# Altium footprint library PCB贴片元件封装库.pcblib: 366 footprints (part 4 of 23)
Each footprint in its own frame and in the unit in brackets; x right, y up, seen from the top. Pads: shape width x height; smd on the part's side, far side on the other; paste and mask are expansions set on the pad; w line width, h text height; cw(c..) or ccw(c..) is an arc to the next point about the centre after c.
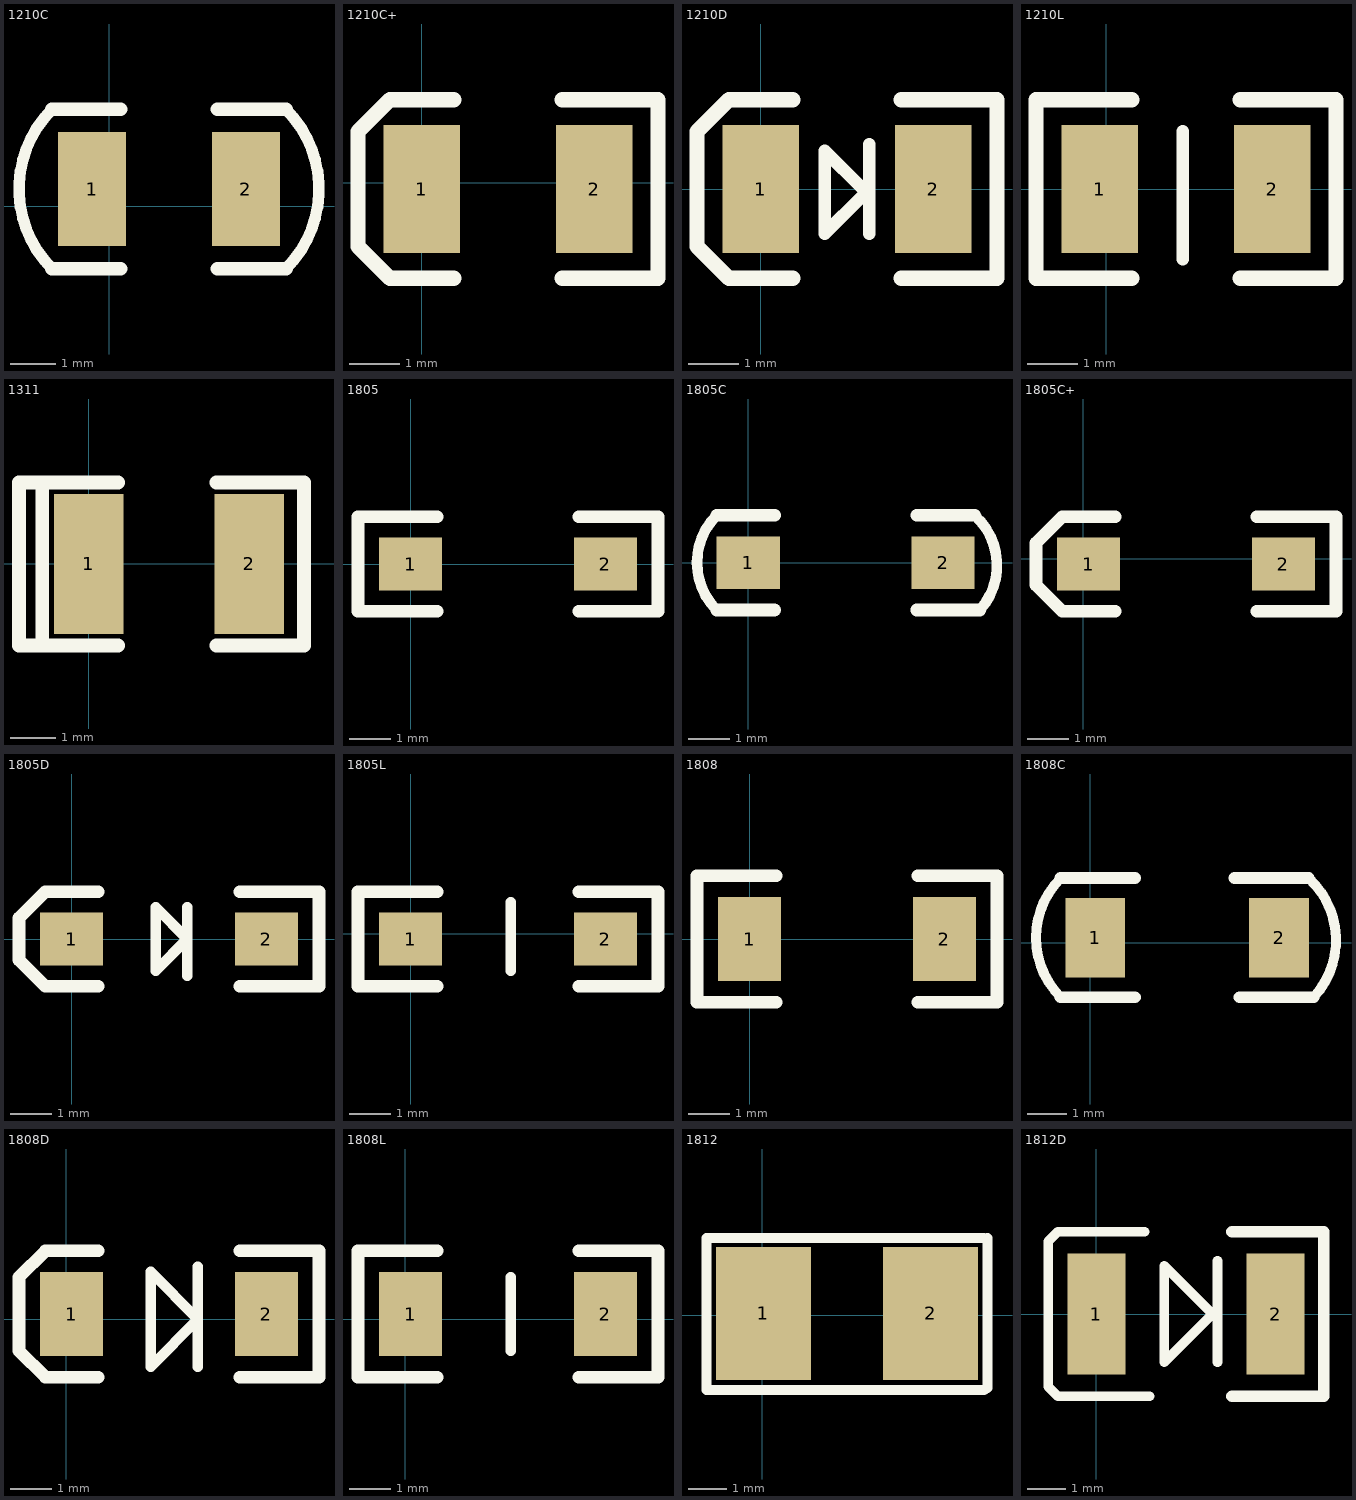
[diagram p3: the footprints below, top view; thin cyan lines are the x and y axes]

## 1210C [mil]
pads (2):
  rect 60x100 smd: 1(-15,15) 2(120,15)
TopOverlay:
  lines w10: -50,-55 cw(c20,15) -50,85 ; 155,-55 ccw(c85,15) 155,85
  lines w12: -50,-55 10,-55 ; -50,85 10,85 ; 95,-55 155,-55 ; 95,85 155,85

## 1210C+ [mil]
pads (2):
  rect 60x100 smd: 1(0,-5) 2(135,-5)
TopOverlay:
  lines w12: 25,-75 -25,-75 -50,-50 -50,40 -25,65 25,65 ; 110,-75 185,-75 185,65 110,65

## 1210D [mil]
pads (2):
  rect 60x100 smd: 1(0,0) 2(135,0)
TopOverlay:
  lines w10: 80,-5 50,-35 50,30 80,0 ; 85,-35 85,35
  lines w12: 25,-70 -25,-70 -50,-45 -50,45 -25,70 25,70 ; 110,-70 185,-70 185,70 110,70

## 1210L [mil]
pads (2):
  rect 60x100 smd: 1(-5,0) 2(130,0)
TopOverlay:
  lines w10: 60,-55 60,45
  lines w12: 20,-70 -55,-70 -55,70 20,70 ; 105,-70 180,-70 180,70 105,70

## 1311 [mil]
pads (2):
  rect 60x120 smd: 1(0,0) 2(138,0)
TopOverlay:
  lines w11.81: -60,-70 -60,70 ; -40,-70 -40,70
  lines w12: -60,-70 25,-70 ; -60,70 25,70 ; 110,-70 185,-70 185,70 110,70

## 1805 [mil]
pads (2):
  rect 60x50 smd: 1(0,0) 2(185,0)
TopOverlay:
  lines w12: 25,-45 -50,-45 -50,45 25,45 ; 160,-45 235,-45 235,45 160,45

## 1805C [mil]
pads (2):
  rect 60x50 smd: 1(0,0) 2(185,0)
TopOverlay:
  lines w10: -30,-45 cw(c15,0) -30,45 ; 215,45 cw(c172.5,-2.5) 220,-45
  lines w12: -30,-45 25,-45 ; -30,45 25,45 ; 160,-45 220,-45 ; 160,45 215,45

## 1805C+ [mil]
pads (2):
  rect 60x50 smd: 1(5,-5) 2(190,-5)
TopOverlay:
  lines w12: 30,-50 -20,-50 -45,-25 -45,15 -20,40 30,40 ; 165,-50 240,-50 240,40 165,40

## 1805D [mil]
pads (2):
  rect 60x50 smd: 1(0,0) 2(185,0)
TopOverlay:
  lines w10: 110,-35 110,30 ; 80,-30 110,0 80,30 80,-30
  lines w12: 25,-45 -25,-45 -50,-20 -50,20 -25,45 25,45 ; 160,-45 235,-45 235,45 160,45

## 1805L [mil]
pads (2):
  rect 60x50 smd: 1(0,-5) 2(185,-5)
TopOverlay:
  lines w10: 95,-35 95,30
  lines w12: 25,-50 -50,-50 -50,40 25,40 ; 160,-50 235,-50 235,40 160,40

## 1808 [mil]
pads (2):
  rect 60x80 smd: 1(0,0) 2(185,0)
TopOverlay:
  lines w12: 25,-60 -50,-60 -50,60 25,60 ; 160,-60 235,-60 235,60 160,60

## 1808C [mil]
pads (2):
  rect 60x80 smd: 1(5,5) 2(190,5)
TopOverlay:
  lines w10: -30,-55 cw(c30,5) -30,65 ; 220,65 cw(c162.5,2.5) 225,-55
  lines w12: -30,-55 45,-55 ; -30,65 45,65 ; 145,65 220,65 ; 150,-55 225,-55

## 1808D [mil]
pads (2):
  rect 60x80 smd: 1(5,5) 2(190,5)
TopOverlay:
  lines w10: 125,-45 125,50 ; 80,-45 80,45 125,0 80,-45
  lines w12: 30,-55 -20,-55 -45,-30 -45,40 -20,65 30,65 ; 165,-55 240,-55 240,65 165,65

## 1808L [mil]
pads (2):
  rect 60x80 smd: 1(5,5) 2(190,5)
TopOverlay:
  lines w10: 100,-30 100,40
  lines w12: 30,-55 -45,-55 -45,65 30,65 ; 165,-55 240,-55 240,65 165,65

## 1812 [mm]
pads (2):
  rect 2.5x3.5 smd: 1(0.032,0.046) 2(4.432,0.046)
TopOverlay:
  lines w0.254: -1.468,-1.969 5.842,-1.969 ; -1.468,-1.905 -1.468,2.032 5.842,2.032 ; 5.932,-1.919 5.932,2.032

## 1812D [mil]
pads (2):
  rect 60x125 smd: 1(0,0) 2(185,0)
TopOverlay:
  lines w10: 50,85 -40,85 -50,75 -50,-75 -40,-85 55,-85 ; 125,-50 125,55 ; 70,-50 70,50 120,0 70,-50
  lines w12: 140,-85 235,-85 235,85 140,85